# Altium footprint library En.PcbLib: 240 footprints (part 1 of 15)
Each footprint in its own frame and in the unit in brackets; x right, y up, seen from the top. Pads: shape width x height; smd on the part's side, far side on the other; paste and mask are expansions set on the pad; w line width, h text height; cw(c..) or ccw(c..) is an arc to the next point about the centre after c.
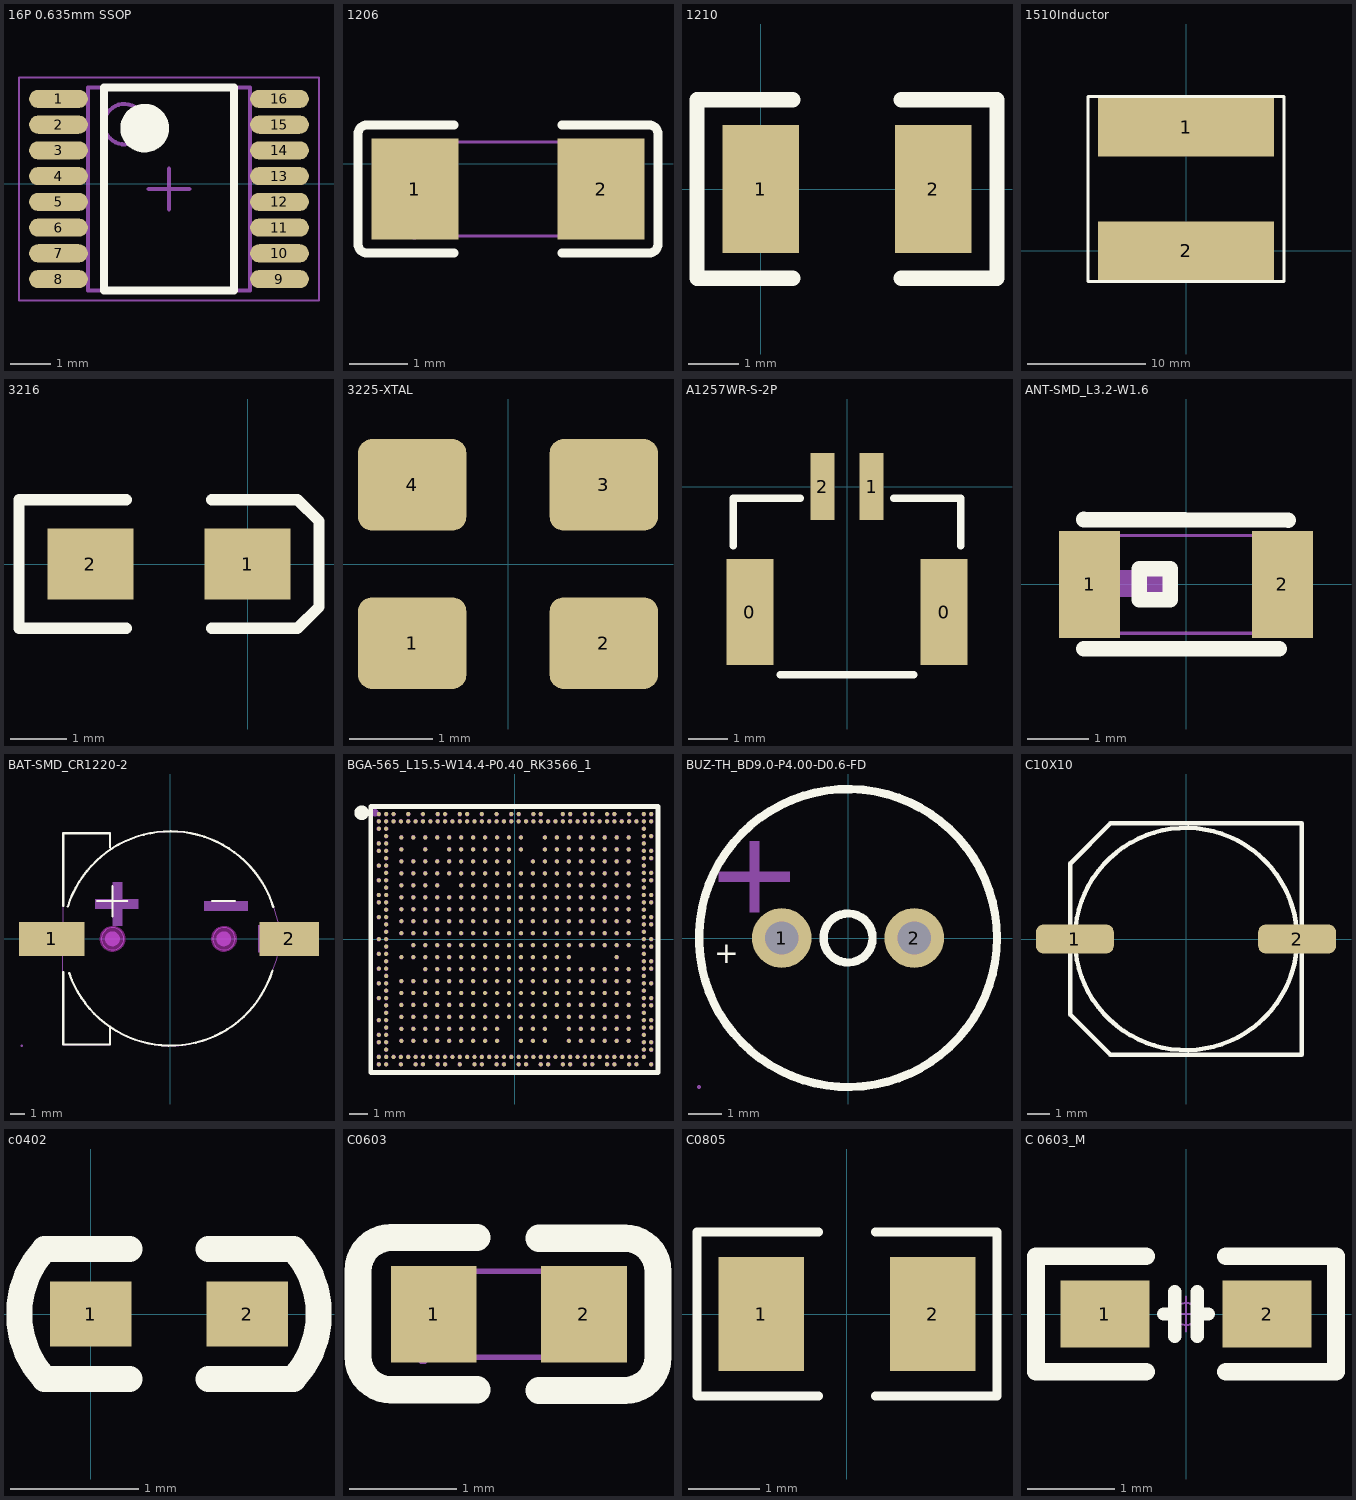
[diagram p0: the footprints below, top view; thin cyan lines are the x and y axes]

## 16P 0.635mm SSOP [mm]
pads (16):
  oval 1.45x0.45 smd: 1(43.757,2.095) 2(43.757,1.46) 3(43.757,0.826) 4(43.757,0.191) 5(43.757,-0.445) 6(43.757,-1.079) 7(43.757,-1.714) 8(43.757,-2.349) 9(49.207,-2.349) 10(49.207,-1.714) 11(49.207,-1.079) 12(49.207,-0.445) 13(49.207,0.191) 14(49.207,0.826) 15(49.207,1.46) 16(49.207,2.095)
Top Overlay:
  circle w0.6: c45.882,1.373 r0.3
  lines w0.2: 44.882,-2.627 44.882,2.373 48.082,2.373 48.082,-2.627 44.882,-2.627
Mechanical 13:
  circle w0.1: c45.382,1.473 r0.5
  lines w0.1: 44.482,-2.627 44.482,2.373 48.482,2.373 48.482,-2.627 44.482,-2.627
Mechanical 15:
  lines w0.05: 42.782,-2.877 42.782,2.623 50.182,2.623 50.182,-2.877 42.782,-2.877
  lines w0.1: 45.982,-0.127 46.982,-0.127 ; 46.482,-0.627 46.482,0.373
3D body "User Library-SSOP16.SLDPRT": height 1.08, standoff -0.02, extent 43.485,-2.616 49.479,2.362

## 1206 [mm]
pads (2):
  rect 1.485x1.728 smd paste-100 mask+0.051: 1(13.417,-0.431) 2(16.602,-0.431)
Top Overlay:
  lines w0.152: 14.083,-1.524 12.598,-1.524 cw(c12.598,-1.372) 12.446,-1.372 12.446,0.509 cw(c12.598,0.509) 12.598,0.661 14.083,0.661 ; 15.936,-1.524 17.421,-1.524 ccw(c17.421,-1.372) 17.573,-1.372 17.573,0.509 ccw(c17.421,0.509) 17.421,0.661 15.936,0.661
Top Paste:
  region: 14.16,-1.195 14.16,-0.825 14.06,-0.725 13.755,-0.725 13.655,-0.625 13.655,-0.238 13.755,-0.138 14.06,-0.138 14.16,-0.038 14.16,0.333 14.06,0.433 12.775,0.433 12.675,0.333 12.675,-1.195 12.775,-1.295 14.06,-1.295
  region: 15.86,-1.195 15.86,-0.825 15.96,-0.725 16.265,-0.725 16.365,-0.625 16.365,-0.238 16.265,-0.138 15.96,-0.138 15.86,-0.038 15.86,0.333 15.96,0.433 17.245,0.433 17.345,0.333 17.345,-1.195 17.245,-1.295 15.96,-1.295
Mechanical 15:
  region: 16.61,-1.231 16.61,0.369 16.11,0.369 16.11,-1.231
  region: 13.41,-1.231 13.41,0.369 13.91,0.369 13.91,-1.231
  region: 13.47,-1.231 13.469,-1.207 13.434,-1.173 13.385,-1.173 13.35,-1.207 13.35,-1.231 13.35,-1.256 13.385,-1.29 13.434,-1.29 13.469,-1.256
  lines w0.051: 13.41,-1.231 16.61,-1.231 16.61,0.369 13.41,0.369 13.41,-1.231
3D body "User Library-C1206-1.sldprt": height 1.11, standoff -0.01, extent 13.411,-1.242 16.611,0.378

## 1210 [mil]
pads (2):
  rect 60x100 smd: 1(0,0) 2(135,0)
Top Overlay:
  lines w12: 25,-70 -50,-70 -50,70 25,70 ; 110,-70 185,-70 185,70 110,70
3D body "User Library-SMD CAPACITOR.sldprt": height 30.35, standoff -0.35, extent 4.01,-49.21 129.99,49.21

## 1510Inductor [mm]
pads (2):
  rect 15x5 smd: 1(0,10.5) 2(0,0)
Top Overlay:
  lines w0.254: -8.35,-2.6 -8.35,13.1 8.35,13.1 8.35,-2.6 -8.35,-2.6
3D body "CSEB1510.stp": height 9.84, standoff -0.04, extent -8.2,-2.45 8.2,12.95

## 3216 [mil]
pads (2):
  rect 60x50 smd: 1(0,0) 2(-110,0)
Top Overlay:
  lines w7.87: -85,-45 -160,-45 -160,45 -85,45 ; -25,-45 35,-45 50,-30 50,30 35,45 -25,45
3D body "User Library-AVX_ACASE.STEP": height 67.32, standoff 0, extent -121.93,-31.14 11.93,35

## 3225-XTAL [mm]
height 1.75
pads (4):
  rrect30% 1.3x1.1 smd: 1(-1.15,-0.95) 2(1.15,-0.95) 3(1.15,0.95) 4(-1.15,0.95)
3D body "3225-XTAL.step": height 0.61, standoff 0, extent -1.6,-1.25 1.6,1.25

## A1257WR-S-2P [mm]
pads (4):
  rect 1.2x2.7 smd: 0(-2.475,-3.2) 0(2.475,-3.2)
  rect 0.6x1.7 smd: 1(0.625,0) 2(-0.625,0)
Top Overlay:
  lines w0.2: -2.9,-1.5 -2.9,-0.3 -1.2,-0.3 ; -1.7,-4.8 1.7,-4.8 ; 1.2,-0.3 2.9,-0.3 2.9,-1.5
3D body "GH1.25-WT-2P.stp": height 4.26, standoff 0, extent -2.874,-4.656 2.874,0.203

## ANT-SMD_L3.2-W1.6 [mm]
pads (2):
  rect 1x1.75 smd: 1(-1.578,0) 2(1.578,0)
Top Overlay:
  lines w0.254: -1.676,-1.05 1.524,-1.05 ; -1.676,1.06 1.676,1.05 ; -0.762,-0.254 -0.762,0.254 -0.254,0.254 -0.254,-0.254 -0.762,-0.254
Mechanical 6:
  region: -1.26,0.228 -0.284,0.228 -0.284,-0.207 -1.26,-0.212 -1.26,-0.18
Mechanical 15:
  region: -1.54,-0.8 -1.54,-0.775 -1.575,-0.74 -1.625,-0.74 -1.66,-0.775 -1.66,-0.8 -1.66,-0.825 -1.625,-0.86 -1.575,-0.86 -1.54,-0.825
  region: 1.1,0.8 1.6,0.8 1.6,-0.8 1.1,-0.8
  region: -1.6,0.8 -1.1,0.8 -1.1,-0.8 -1.6,-0.8
  lines w0.051: -1.6,-0.8 1.6,-0.8 1.6,0.8 -1.6,0.8 -1.6,-0.8
3D body "ant3216ll00r2400a.step": height 1.29, standoff -0.02, extent -1.6,-0.8 1.6,0.8

## BAT-SMD_CR1220-2 [mm]
pads (2):
  rect 4.4x2.3 smd paste+0 mask+0.05: 1(-8,0)
  rect 4x2.3 smd paste+0 mask+0.05: 2(8,0)
Top Overlay:
  lines w0.15: -7.22,-2.231 -7.22,-7.112 -4.064,-7.112 -4.064,-5.912 ; -7.22,2.231 -7.22,7.112 -4.064,7.112 -4.064,6.171 ; -6.911,2.175 cw(c0,0) 6.918,2.154 ; -6.815,-2.297 ccw(c0,0) 6.871,-2.124 ; -4.928,2.54 -2.896,2.54 ; -3.912,1.524 -3.912,3.556 ; 2.819,2.54 4.343,2.54
Keep-Out Layer:
  board cut-out: 4.35,0 4.349,0.098 4.296,0.287 4.197,0.456 4.058,0.594 3.887,0.691 3.698,0.741 3.502,0.741 3.313,0.691 3.142,0.594 3.003,0.456 2.904,0.287 2.851,0.098 2.85,0 2.851,-0.098 2.904,-0.287 3.003,-0.456 3.142,-0.594 3.313,-0.691 3.502,-0.741 3.698,-0.741 3.887,-0.691 4.058,-0.594 4.197,-0.456 4.296,-0.287 4.349,-0.098
  board cut-out: -3.15,0 -3.151,0.098 -3.204,0.287 -3.303,0.456 -3.442,0.594 -3.612,0.691 -3.802,0.741 -3.998,0.741 -4.187,0.691 -4.357,0.594 -4.497,0.456 -4.596,0.287 -4.649,0.098 -4.65,0 -4.649,-0.098 -4.596,-0.287 -4.497,-0.456 -4.357,-0.594 -4.187,-0.691 -3.998,-0.741 -3.802,-0.741 -3.612,-0.691 -3.442,-0.594 -3.303,-0.456 -3.204,-0.287 -3.151,-0.098
Mechanical 1:
  circle w0.025: c3.6,0 r0.75
  circle w0.025: c-3.9,0 r0.75
Mechanical 6:
  circle w0.5: c3.581,0 r0.25
  circle w0.5: c-3.912,0 r0.25
  region: -5.08,2.667 -2.159,2.667 -2.159,2.032 -5.08,2.032
  region: -3.898,0.873 -3.898,3.794 -3.263,3.794 -3.263,0.873
  region: 2.271,2.516 5.192,2.516 5.192,1.881 2.271,1.881
Mechanical 15:
  region: -9.96,-7.206 -9.96,-7.181 -9.995,-7.146 -10.045,-7.146 -10.08,-7.181 -10.08,-7.206 -10.08,-7.231 -10.045,-7.266 -9.995,-7.266 -9.96,-7.231
  region: 9.32,-0.9 5.92,-0.9 5.92,0.9 9.32,0.9
  region: -10.02,0.9 -6.62,0.9 -6.62,-0.9 -10.02,-0.9
  lines w0.051: -7.227,7.143 -4.025,7.143 -4.029,7.138 -4.029,6.158 -4.034,6.026 -3.892,6.12 -3.737,6.213 -3.533,6.328 -2.705,6.719 -2.26,6.874 -1.822,7.001 -1.372,7.108 -0.913,7.183 -0.43,7.221 0.047,7.243 0.92,7.185 1.359,7.11 1.772,7.015 2.202,6.897 2.616,6.754 3.437,6.38 4.304,5.829 4.691,5.512 5.066,5.174 5.711,4.465 6.281,3.597 6.671,2.831 6.938,2.064 7.241,1.031 7.344,0.515 7.382,-0.006 7.334,-0.461 7.258,-0.92 7.156,-1.399 6.986,-1.838 6.681,-2.672 6.281,-3.543 5.813,-4.226 5.559,-4.55 5.277,-4.874 4.979,-5.172 4.665,-5.454 4.359,-5.715 4.033,-5.951 3.59,-6.24 3.118,-6.481 2.165,-6.879 1.092,-7.119 0.544,-7.183 0.003,-7.206 -0.521,-7.188 -1.045,-7.132 -1.568,-7.029 -2.092,-6.898 -2.614,-6.711 -3.131,-6.487 -3.645,-6.212 -3.896,-6.049 -4.04,-5.967 -4.064,-5.857 -4.064,-7.127 -7.239,-7.127 -7.239,-0.523 -7.227,-0.511 -7.227,7.142 ; -7.227,7.142 -7.227,7.143
Multi-Layer keep-out:
  circle w0.254: c3.6,0 r0.75
  circle w0.254: c-3.9,0 r0.75
3D body "cr1220-2.step": height 4.05, standoff -0.85, extent -10.34,-7.45 9.416,7.45

## BGA-565_L15.5-W14.4-P0.40_RK3566_1 [mm]
pads (565):
  round 0.22 smd: 1A1(-6.175,5.525) 1A2(-5.525,5.525) 1A3(-4.875,5.525) 1A4(-4.225,5.525) 1A5(-3.575,5.525) 1A6(-2.925,5.525) 1A7(-2.275,5.525) 1A8(-1.625,5.525) 1A9(-0.975,5.525) 1A10(-0.325,5.525) 1A11(0.325,5.525) 1A13(1.625,5.525) 1A14(2.275,5.525) 1A15(2.925,5.525) 1A16(3.575,5.525) 1A17(4.225,5.525) 1A18(4.875,5.525) 1A19(5.525,5.525) 1A20(6.175,5.525) 1B1(-6.175,4.875) 1B3(-4.875,4.875) 1B5(-3.575,4.875) 1B6(-2.925,4.875) 1B7(-2.275,4.875) 1B8(-1.625,4.875) 1B9(-0.975,4.875) 1B10(-0.325,4.875) 1B11(0.325,4.875) 1B13(1.625,4.875) 1B14(2.275,4.875) 1B15(2.925,4.875) 1B16(3.575,4.875) 1B17(4.225,4.875) 1B18(4.875,4.875) 1B19(5.525,4.875) 1B20(6.175,4.875) 1C1(-6.175,4.225) 1C2(-5.525,4.225) 1C3(-4.875,4.225) 1C4(-4.225,4.225) 1C5(-3.575,4.225) 1C6(-2.925,4.225) 1C7(-2.275,4.225) 1C8(-1.625,4.225) 1C9(-0.975,4.225) 1C10(-0.325,4.225) 1C12(0.975,4.225) 1C13(1.625,4.225) 1C14(2.275,4.225) 1C15(2.925,4.225) 1C16(3.575,4.225) 1C17(4.225,4.225) 1C18(4.875,4.225) 1C19(5.525,4.225) 1C20(6.175,4.225) 1D1(-6.175,3.575) 1D2(-5.525,3.575) 1D3(-4.875,3.575) 1D4(-4.225,3.575) 1D5(-3.575,3.575) 1D6(-2.925,3.575) 1D7(-2.275,3.575) 1D8(-1.625,3.575) 1D9(-0.975,3.575) 1D10(-0.325,3.575) 1D11(0.325,3.575) 1D12(0.975,3.575) 1D13(1.625,3.575) 1D14(2.275,3.575) 1D15(2.925,3.575) 1D16(3.575,3.575) 1D17(4.225,3.575) 1D18(4.875,3.575) 1D19(5.525,3.575) 1D20(6.175,3.575) 1E1(-6.175,2.925) 1E2(-5.525,2.925) 1E3(-4.875,2.925) 1E4(-4.225,2.925) 1E6(-2.925,2.925) 1E7(-2.275,2.925) 1E8(-1.625,2.925) 1E9(-0.975,2.925) 1E10(-0.325,2.925) 1E11(0.325,2.925) 1E12(0.975,2.925) 1E13(1.625,2.925) 1E14(2.275,2.925) 1E15(2.925,2.925) 1E16(3.575,2.925) 1E17(4.225,2.925) 1E18(4.875,2.925) 1E19(5.525,2.925) 1E20(6.175,2.925) 1F1(-6.175,2.275) 1F2(-5.525,2.275) 1F3(-4.875,2.275) 1F4(-4.225,2.275) 1F5(-3.575,2.275) 1F6(-2.925,2.275) 1F7(-2.275,2.275) 1F8(-1.625,2.275) 1F9(-0.975,2.275) 1F10(-0.325,2.275) 1F11(0.325,2.275) 1F12(0.975,2.275) 1F13(1.625,2.275) 1F14(2.275,2.275) 1F15(2.925,2.275) 1F16(3.575,2.275) 1F17(4.225,2.275) 1F18(4.875,2.275) 1F19(5.525,2.275) 1F20(6.175,2.275) 1G1(-6.175,1.625) 1G2(-5.525,1.625) 1G3(-4.875,1.625) 1G4(-4.225,1.625) 1G5(-3.575,1.625) 1G6(-2.925,1.625) 1G7(-2.275,1.625) 1G8(-1.625,1.625) 1G9(-0.975,1.625) 1G10(-0.325,1.625) 1G11(0.325,1.625) 1G12(0.975,1.625) 1G13(1.625,1.625) 1G14(2.275,1.625) 1G15(2.925,1.625) 1G16(3.575,1.625) 1G17(4.225,1.625) 1G18(4.875,1.625) 1G19(5.525,1.625) 1G20(6.175,1.625) 1H1(-6.175,0.975) 1H2(-5.525,0.975) 1H3(-4.875,0.975) 1H4(-4.225,0.975) 1H5(-3.575,0.975) 1H6(-2.925,0.975) 1H7(-2.275,0.975) 1H8(-1.625,0.975) 1H9(-0.975,0.975) 1H10(-0.325,0.975) 1H11(0.325,0.975) 1H12(0.975,0.975) 1H13(1.625,0.975) 1H14(2.275,0.975) 1H15(2.925,0.975) 1H16(3.575,0.975) 1H17(4.225,0.975) 1H18(4.875,0.975) 1H19(5.525,0.975) 1H20(6.175,0.975) 1J1(-6.175,0.325) 1J2(-5.525,0.325) 1J3(-4.875,0.325) 1J4(-4.225,0.325) 1J5(-3.575,0.325) 1J6(-2.925,0.325) 1J7(-2.275,0.325) 1J8(-1.625,0.325) 1J9(-0.975,0.325) 1J10(-0.325,0.325) 1J11(0.325,0.325) 1J12(0.975,0.325) 1J13(1.625,0.325) 1J14(2.275,0.325) 1J15(2.925,0.325) 1J16(3.575,0.325) 1J17(4.225,0.325) 1J18(4.875,0.325) 1J19(5.525,0.325) 1J20(6.175,0.325) 1K2(-5.525,-0.325) 1K3(-4.875,-0.325) 1K4(-4.225,-0.325) 1K5(-3.575,-0.325) 1K6(-2.925,-0.325) 1K7(-2.275,-0.325) 1K8(-1.625,-0.325) 1K9(-0.975,-0.325) 1K10(-0.325,-0.325) 1K11(0.325,-0.325) 1K12(0.975,-0.325) 1K13(1.625,-0.325) 1K14(2.275,-0.325) 1K15(2.925,-0.325) 1K16(3.575,-0.325) 1K17(4.225,-0.325) 1K18(4.875,-0.325) 1K19(5.525,-0.325) 1K20(6.175,-0.325) 1L1(-6.175,-0.975) 1L2(-5.525,-0.975) 1L3(-4.875,-0.975) 1L4(-4.225,-0.975) 1L5(-3.575,-0.975) 1L6(-2.925,-0.975) 1L7(-2.275,-0.975) 1L8(-1.625,-0.975) 1L9(-0.975,-0.975) 1L10(-0.325,-0.975) 1L11(0.325,-0.975) 1L12(0.975,-0.975) 1L13(1.625,-0.975) 1L14(2.275,-0.975) 1L15(2.925,-0.975) 1L19(5.525,-0.975) 1M3(-4.875,-1.625) 1M4(-4.225,-1.625) 1M5(-3.575,-1.625) 1M6(-2.925,-1.625) 1M7(-2.275,-1.625) 1M8(-1.625,-1.625) 1M9(-0.975,-1.625) 1M10(-0.325,-1.625) 1M11(0.325,-1.625) 1M12(0.975,-1.625) 1M13(1.625,-1.625) 1M14(2.275,-1.625) 1M15(2.925,-1.625) 1M16(3.575,-1.625) 1M17(4.225,-1.625) 1M18(4.875,-1.625) 1M19(5.525,-1.625) 1M20(6.175,-1.625) 1N1(-6.175,-2.275) 1N2(-5.525,-2.275) 1N3(-4.875,-2.275) 1N4(-4.225,-2.275) 1N5(-3.575,-2.275) 1N6(-2.925,-2.275) 1N7(-2.275,-2.275) 1N8(-1.625,-2.275) 1N9(-0.975,-2.275) 1N10(-0.325,-2.275) 1N11(0.325,-2.275) 1N12(0.975,-2.275) 1N13(1.625,-2.275) 1N14(2.275,-2.275) 1N15(2.925,-2.275) 1N16(3.575,-2.275) 1N17(4.225,-2.275) 1N18(4.875,-2.275) 1N19(5.525,-2.275) 1N20(6.175,-2.275) 1P1(-6.175,-2.925) 1P2(-5.525,-2.925) 1P3(-4.875,-2.925) 1P4(-4.225,-2.925) 1P5(-3.575,-2.925) 1P6(-2.925,-2.925) 1P7(-2.275,-2.925) 1P8(-1.625,-2.925) 1P9(-0.975,-2.925) 1P10(-0.325,-2.925) 1P11(0.325,-2.925) 1P12(0.975,-2.925) 1P13(1.625,-2.925) 1P14(2.275,-2.925) 1P15(2.925,-2.925) 1P16(3.575,-2.925) 1P17(4.225,-2.925) 1P18(4.875,-2.925) 1P19(5.525,-2.925) 1P20(6.175,-2.925) 1R1(-6.175,-3.575) 1R2(-5.525,-3.575) 1R3(-4.875,-3.575) 1R4(-4.225,-3.575) 1R5(-3.575,-3.575) 1R6(-2.925,-3.575) 1R7(-2.275,-3.575) 1R8(-1.625,-3.575) 1R9(-0.975,-3.575) 1R10(-0.325,-3.575) 1R11(0.325,-3.575) 1R12(0.975,-3.575) 1R13(1.625,-3.575) 1R14(2.275,-3.575) 1R15(2.925,-3.575) 1R16(3.575,-3.575) 1R17(4.225,-3.575) 1R18(4.875,-3.575) 1R19(5.525,-3.575) 1R20(6.175,-3.575) 1T1(-6.175,-4.225) 1T2(-5.525,-4.225) 1T3(-4.875,-4.225) 1T4(-4.225,-4.225) 1T5(-3.575,-4.225) 1T6(-2.925,-4.225) 1T7(-2.275,-4.225) 1T8(-1.625,-4.225) 1T9(-0.975,-4.225) 1T10(-0.325,-4.225) 1T11(0.325,-4.225) 1T12(0.975,-4.225) 1T13(1.625,-4.225) 1T14(2.275,-4.225) 1T15(2.925,-4.225) 1T16(3.575,-4.225) 1T17(4.225,-4.225) 1T18(4.875,-4.225) 1T19(5.525,-4.225) 1T20(6.175,-4.225) 1U1(-6.175,-4.875) 1U2(-5.525,-4.875) 1U3(-4.875,-4.875) 1U4(-4.225,-4.875) 1U5(-3.575,-4.875) 1U6(-2.925,-4.875) 1U7(-2.275,-4.875) 1U8(-1.625,-4.875) 1U9(-0.975,-4.875) 1U11(0.325,-4.875) 1U12(0.975,-4.875) 1U13(1.625,-4.875) 1U15(2.925,-4.875) 1U16(3.575,-4.875) 1U17(4.225,-4.875) 1U18(4.875,-4.875) 1U19(5.525,-4.875) 1U20(6.175,-4.875) 1V1(-6.175,-5.525) 1V2(-5.525,-5.525) 1V3(-4.875,-5.525) 1V4(-4.225,-5.525) 1V5(-3.575,-5.525) 1V6(-2.925,-5.525) 1V7(-2.275,-5.525) 1V8(-1.625,-5.525) 1V9(-0.975,-5.525) 1V11(0.325,-5.525) 1V12(0.975,-5.525) 1V13(1.625,-5.525) 1V15(2.925,-5.525) 1V16(3.575,-5.525) 1V17(4.225,-5.525) 1V18(4.875,-5.525) 1V19(5.525,-5.525) 1V20(6.175,-5.525)
  round 0.22 smd paste+0 mask+0.038: A1(-7.4,6.8) A2(-7,6.8) A3(-6.6,6.8) A5(-5.8,6.8) A7(-5,6.8) A9(-4.2,6.8) A10(-3.8,6.8) A12(-3,6.8) A13(-2.6,6.8) A15(-1.8,6.8) A17(-1,6.8) A19(-0.2,6.8) A20(0.2,6.8) A22(1,6.8) A23(1.4,6.8) A26(2.6,6.8) A27(3,6.8) A29(3.8,6.8) A30(4.2,6.8) A32(5,6.8) A33(5.4,6.8) A35(6.2,6.8) A37(7,6.8) A38(7.4,6.8) AA2(-7,-1.2) AA37(7,-1.2) AA38(7.4,-1.2) AB1(-7.4,-1.6) AB2(-7,-1.6) AB37(7,-1.6) AB38(7.4,-1.6) AC2(-7,-2) AC37(7,-2) AD1(-7.4,-2.4) AD2(-7,-2.4) AD37(7,-2.4) AD38(7.4,-2.4) AE2(-7,-2.8) AE37(7,-2.8) AF1(-7.4,-3.2) AF2(-7,-3.2) AF37(7,-3.2) AF38(7.4,-3.2) AG2(-7,-3.6) AG37(7,-3.6) AG38(7.4,-3.6) AH2(-7,-4) AH37(7,-4) AJ1(-7.4,-4.4) AJ2(-7,-4.4) AJ37(7,-4.4) AJ38(7.4,-4.4) AK2(-7,-4.8) AK37(7,-4.8) AK38(7.4,-4.8) AL1(-7.4,-5.2) AL2(-7,-5.2) AL37(7,-5.2) AM1(-7.4,-5.6) AM2(-7,-5.6) AM37(7,-5.6) AM38(7.4,-5.6) AN2(-7,-6) AN37(7,-6) AN38(7.4,-6) AP1(-7.4,-6.4) AP2(-7,-6.4) AP3(-6.6,-6.4) AP4(-6.2,-6.4) AP5(-5.8,-6.4) AP6(-5.4,-6.4) AP7(-5,-6.4) AP8(-4.6,-6.4) AP9(-4.2,-6.4) AP10(-3.8,-6.4) AP11(-3.4,-6.4) AP12(-3,-6.4) AP13(-2.6,-6.4) AP14(-2.2,-6.4) AP15(-1.8,-6.4) AP16(-1.4,-6.4) AP17(-1,-6.4) AP18(-0.6,-6.4) AP19(-0.2,-6.4) AP20(0.2,-6.4) AP21(0.6,-6.4) AP22(1,-6.4) AP23(1.4,-6.4) AP24(1.8,-6.4) AP25(2.2,-6.4) AP26(2.6,-6.4) AP27(3,-6.4) AP28(3.4,-6.4) AP29(3.8,-6.4) AP30(4.2,-6.4) AP31(4.6,-6.4) AP32(5,-6.4) AP33(5.4,-6.4) AP34(5.8,-6.4) AP35(6.2,-6.4) AP36(6.6,-6.4) AP37(7,-6.4) AR1(-7.4,-6.8) AR2(-7,-6.8) AR4(-6.2,-6.8) AR6(-5.4,-6.8) AR7(-5,-6.8) AR9(-4.2,-6.8) AR10(-3.8,-6.8) AR12(-3,-6.8) AR14(-2.2,-6.8) AR15(-1.8,-6.8) AR17(-1,-6.8) AR18(-0.6,-6.8) AR20(0.2,-6.8) AR21(0.6,-6.8) AR23(1.4,-6.8) AR24(1.8,-6.8) AR26(2.6,-6.8) AR27(3,-6.8) AR29(3.8,-6.8) AR30(4.2,-6.8) AR32(5,-6.8) AR33(5.4,-6.8) AR35(6.2,-6.8) AR36(6.6,-6.8) AR38(7.4,-6.8) B1(-7.4,6.4) B2(-7,6.4) B3(-6.6,6.4) B4(-6.2,6.4) B5(-5.8,6.4) B6(-5.4,6.4) B7(-5,6.4) B8(-4.6,6.4) B9(-4.2,6.4) B10(-3.8,6.4) B11(-3.4,6.4) B12(-3,6.4) B13(-2.6,6.4) B14(-2.2,6.4) B15(-1.8,6.4) B16(-1.4,6.4) B17(-1,6.4) B18(-0.6,6.4) B19(-0.2,6.4) B20(0.2,6.4) B21(0.6,6.4) B22(1,6.4) B23(1.4,6.4) B24(1.8,6.4) B25(2.2,6.4) B26(2.6,6.4) B27(3,6.4) B28(3.4,6.4) B29(3.8,6.4) B30(4.2,6.4) B31(4.6,6.4) B32(5,6.4) B33(5.4,6.4) B34(5.8,6.4) B35(6.2,6.4) B36(6.6,6.4) B37(7,6.4) B38(7.4,6.4) C1(-7.4,6) C2(-7,6) C37(7,6) D2(-7,5.6) D37(7,5.6) D38(7.4,5.6) E1(-7.4,5.2) E2(-7,5.2) E37(7,5.2) F1(-7.4,4.8) F2(-7,4.8) F37(7,4.8) F38(7.4,4.8) G2(-7,4.4) G37(7,4.4) G38(7.4,4.4) H1(-7.4,4) H2(-7,4) H37(7,4) J2(-7,3.6) J37(7,3.6) J38(7.4,3.6) K1(-7.4,3.2) K2(-7,3.2) K37(7,3.2) K38(7.4,3.2) L2(-7,2.8) L37(7,2.8) M1(-7.4,2.4) M2(-7,2.4) M37(7,2.4) M38(7.4,2.4) N1(-7.4,2) N2(-7,2) N37(7,2) N38(7.4,2) P2(-7,1.6) P37(7,1.6) R1(-7.4,1.2) R2(-7,1.2) R37(7,1.2) R38(7.4,1.2) T2(-7,0.8) T37(7,0.8) T38(7.4,0.8) U2(-7,0.4) U37(7,0.4) V1(-7.4,0) V2(-7,0) V37(7,0) V38(7.4,0) W2(-7,-0.4) W37(7,-0.4) W38(7.4,-0.4) Y1(-7.4,-0.8) Y2(-7,-0.8) Y37(7,-0.8)
Top Overlay:
  circle w0.4: c-8.33,6.87 r0.2
  lines w0.254: -7.83,-7.24 7.77,-7.24 7.77,7.21 -7.83,7.21 -7.83,-7.24
Mechanical 6:
  circle w0.2: c-7.61,6.87 r0.1
Mechanical 15:
  drawing of 570 lines, arcs and shapes, not listed
3D body "rk3566.step": height 0.75, standoff -0.01, extent -7.75,-7.2 7.75,7.2

## BUZ-TH_BD9.0-P4.00-D0.6-FD [mm]
pads (2):
  round 1.8 hole 1: 1(-2,0) 2(2,0)
Top Overlay:
  circle w0.254: c0,0 r0.741
  circle w0.254: c0,0 r4.5
  text "+" at -4.04,-0.769 h0.65
Mechanical 6:
  region: -2.975,0.779 -2.975,2.919 -2.685,2.919 -2.685,0.779
  region: -3.9,1.995 -1.76,1.995 -1.76,1.705 -3.9,1.705
Mechanical 15:
  region: 2.3,0 2.299,0.059 2.252,0.167 2.168,0.25 2.059,0.294 1.941,0.294 1.832,0.25 1.748,0.167 1.701,0.059 1.7,0 1.701,-0.059 1.748,-0.167 1.832,-0.25 1.941,-0.294 2.059,-0.294 2.168,-0.25 2.252,-0.167 2.299,-0.059
  region: -1.7,0 -1.701,0.059 -1.748,0.167 -1.832,0.25 -1.941,0.294 -2.059,0.294 -2.168,0.25 -2.252,0.167 -2.299,0.059 -2.3,0 -2.299,-0.059 -2.252,-0.167 -2.168,-0.25 -2.059,-0.294 -1.941,-0.294 -1.832,-0.25 -1.748,-0.167 -1.701,-0.059
  region: -4.441,-4.5 -4.441,-4.475 -4.476,-4.44 -4.526,-4.44 -4.561,-4.475 -4.561,-4.5 -4.561,-4.525 -4.526,-4.56 -4.476,-4.56 -4.441,-4.525
  lines w0.051: -0.003,-4.5 cw(c-0.001,0) 0,-4.5 -0.003,-4.5
3D body "User Library-Buzzer_9mm_Membran.sldprt": height 0, standoff -0.2, extent -2.5,-2.497 2.5,2.497
3D body "User Library-Buzzer_9mm_Fillet003.sldprt": height -0.43, standoff -6.03, extent -4.677,-4.677 4.423,4.423
3D body "User Library-Buzzer_9mm_Pin_-.sldprt": height 4.4, standoff 0, extent 1.732,-0.3 2.332,0.3
3D body "User Library-Buzzer_9mm_Pin_+.sldprt": height 5.4, standoff 0, extent -2.332,-0.3 -1.732,0.3

## C10X10 [mm]
pads (2):
  rrect50% 3.5x1.3 smd: 1(-5,0) 2(5,0)
Top Overlay:
  circle w0.2: c0,0 r5
  lines w0.2: -5.2,3.404 -5.2,-3.404 -3.404,-5.2 5.2,-5.2 5.2,5.2 -3.404,5.2 -5.191,3.413
3D body "SW3dPS-capacitor size G.STEP": height 10.21, standoff -0.01, extent -5.775,-5.118 5.825,5.182

## c0402 [mil]
pads (2):
  rect 25x20 smd: 1(0,0) 2(48.2,0)
Top Overlay:
  lines w8: -14.14,-19.97 cw(c7.27,0) -14.14,19.97 ; -14,-20 12,-20 ; -14,20 12,20 ; 36.2,-20 62.2,-20 ; 36.2,20 62.2,20 ; 62.34,-19.97 ccw(c40.93,0) 62.34,19.97
3D body "cap_0402.STEP": height 19.68, standoff 0, extent 4.51,-9.84 43.88,9.84

## C0603 [mm]
pads (2):
  rect 0.8x0.9 smd: 1(14.929,2.234) 2(16.33,2.234)
Top Overlay:
  lines w0.254: 15.334,1.53 14.534,1.53 cw(c14.534,1.84) 14.224,1.84 14.224,2.64 cw(c14.534,2.64) 14.534,2.949 15.334,2.949 ; 15.91,1.524 16.71,1.524 ccw(c16.71,1.834) 17.02,1.834 17.02,2.634 ccw(c16.71,2.634) 16.71,2.944 15.91,2.944
Mechanical 15:
  region: 14.83,1.834 14.83,2.634 15.13,2.634 15.13,1.834
  region: 16.43,1.834 16.43,2.634 16.13,2.634 16.13,1.834
  region: 14.889,1.834 14.889,1.859 14.854,1.894 14.804,1.894 14.769,1.859 14.769,1.834 14.769,1.809 14.805,1.774 14.854,1.774 14.889,1.809
  lines w0.051: 14.83,1.834 14.83,2.634 16.43,2.634 16.43,1.834 14.83,1.834
3D body "User Library-SMD CAPACITOR.sldprt": height 0.78, standoff -0.02, extent 14.821,1.835 16.421,2.635

## C0805 [mm]
pads (2):
  rect 1.2x1.6 smd: 1(-1.2,0) 2(1.2,0)
Top Overlay:
  lines w0.127: -0.4,-1.15 -2.1,-1.15 -2.1,1.15 -0.4,1.15 ; 0.4,-1.15 2.1,-1.15 2.1,1.15 0.4,1.15
3D body "Capacitor 0805 SMD.step": height 0.93, standoff -0.01, extent -1.455,-0.719 1.545,0.681

## C 0603_M [mil] "无极性贴片电容"
height 370.08
pads (2):
  rect 40x30 smd: 1(-36.5,0) 2(36.5,0)
Top Overlay:
  lines w6: -10,0 -5,0 ; -5,-10 -5,10 ; 5,-10 5,10 ; 5,0 10,0
  lines w8: -18,-26 -67.5,-26 -67.5,26 -18,26 ; 18,-26 67.5,-26 67.5,26 18,26
Mechanical 15:
  circle w1: c0,0 r5
  lines w1: -7.87,0 7.87,0 ; 0,-7.87 0,7.87
3D body "C 0603.STEP": height 31.89, standoff -0.39, extent -31.5,-16.14 31.5,16.14